# Altium footprint library Mine.PcbLib: 306 footprints (part 19 of 20)
Each footprint in its own frame and in the unit in brackets; x right, y up, seen from the top. Pads: shape width x height; smd on the part's side, far side on the other; paste and mask are expansions set on the pad; w line width, h text height; cw(c..) or ccw(c..) is an arc to the next point about the centre after c.
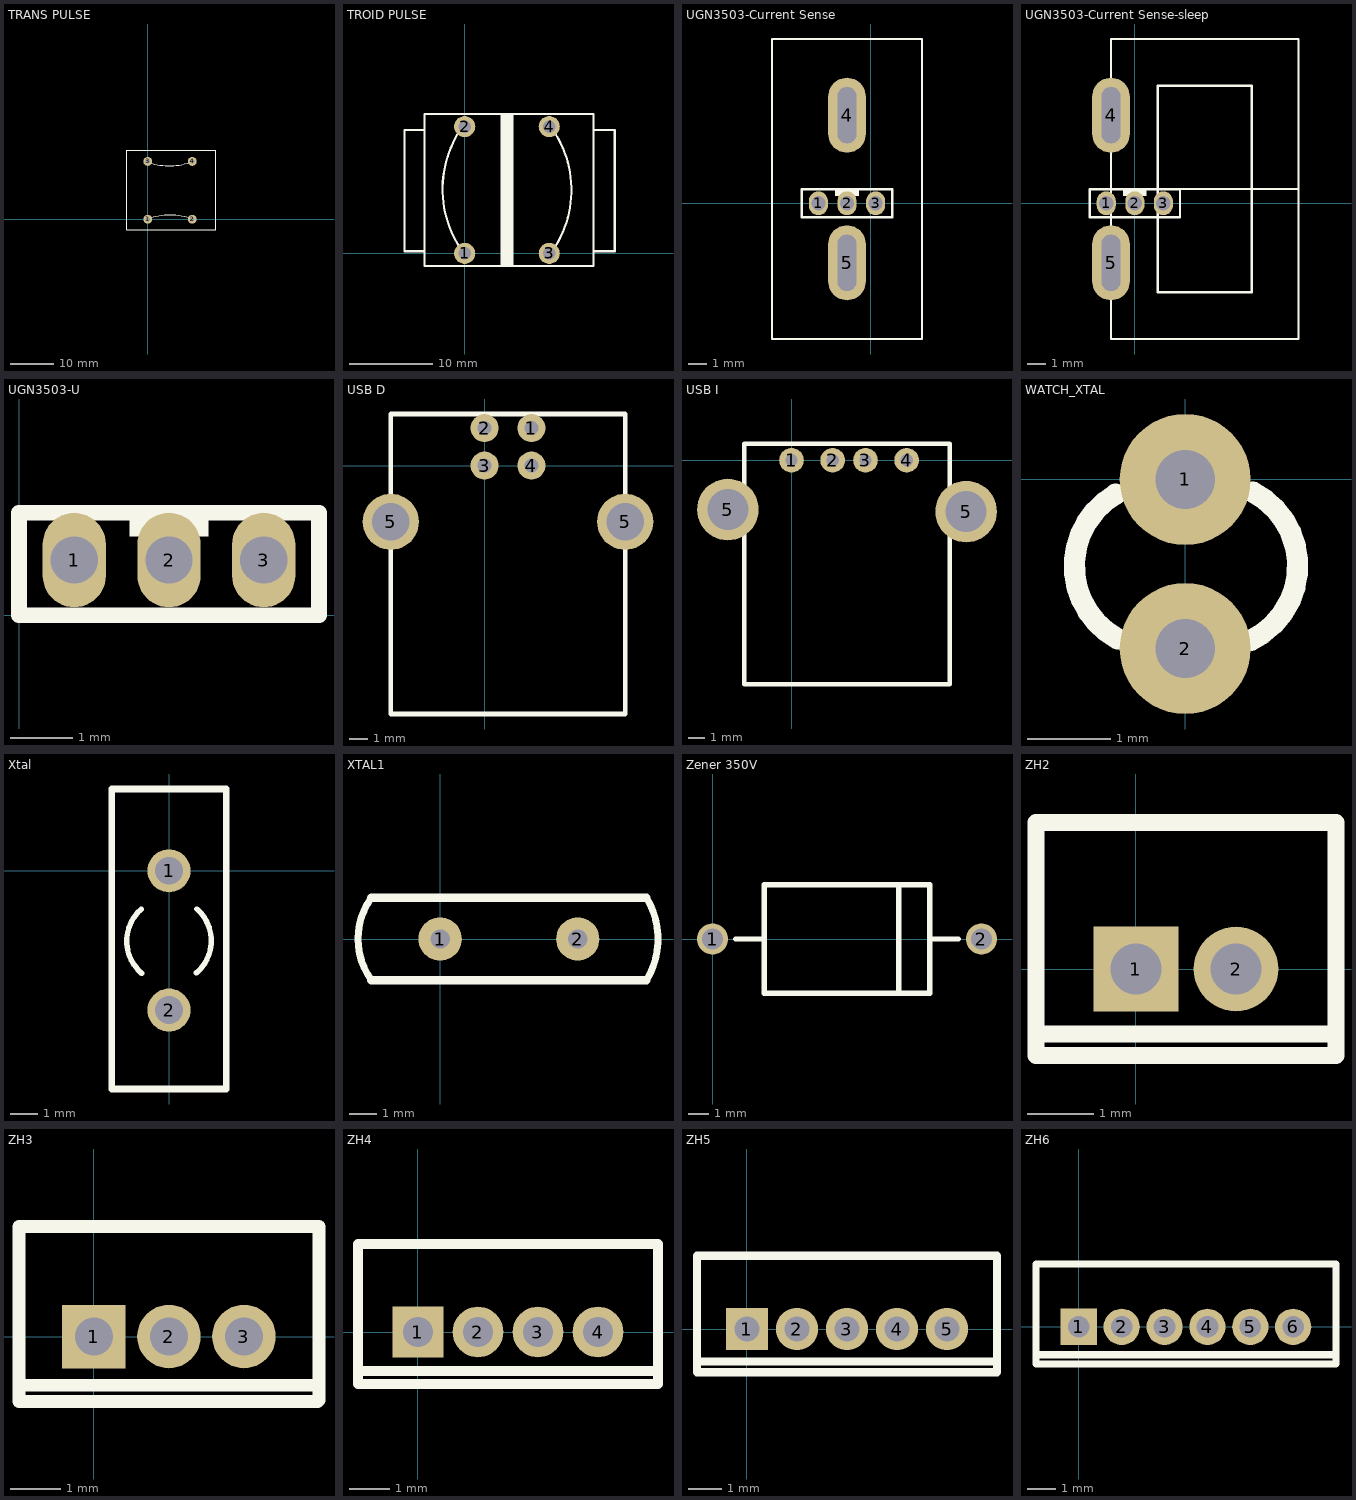
[diagram p18: the footprints below, top view; thin cyan lines are the x and y axes]

## TRANS PULSE [mil]
pads (4):
  round 80 hole 40: 1(0,0) 2(400,0) 3(0,520) 4(400,520)
Top Overlay:
  lines w10: -9.33,516.57 ccw(c190.87,1050.46) 400,520 ; 0,0 cw(c200,-520) 400,0 ; -190,-95 610,-95 610,620 -190,620 -190,-95

## TROID PULSE [mil]
pads (4):
  round 100 hole 60: 1(0,0) 2(0,600) 3(400,0) 4(400,600)
Top Overlay:
  rectangle: 170,-60 230,660
  lines w10: -190,10 -285,10 -285,585 -190,585 ; -7.1,605.17 ccw(c405,305) -2.26,-1.7 ; 404.08,-3.06 ccw(c0,300) 404.08,603.06 ; 610,10 710,10 710,585 610,585 ; -190,-60 610,-60 610,660 -190,660 -190,-60

## UGN3503-Current Sense [mil]
height 393.7
pads (5):
  oval 40x50 hole 30: 1(-110,0) 2(-50,0) 3(10,0)
  oval 78.74x157.48 hole 39.37 slot 118.11 at 90 deg: 4(-50,185) 5(-50,-125)
Top Overlay:
  rectangle: -75,15 -25,29
  lines w5: -207.48,-284.96 -207.48,344.96 107.48,344.96 107.48,-284.96 -207.48,-284.96 ; -145,-29.53 45,-29.53 45,29.53 -145,29.53 -145,-29.53

## UGN3503-Current Sense-sleep [mil]
height 393.7
pads (5):
  oval 40x50 hole 30: 1(-60,0) 2(0,0) 3(60,0)
  oval 78.74x157.48 hole 39.37 slot 118.11 at 90 deg: 4(-50,185) 5(-50,-125)
Top Overlay:
  rectangle: -25,15 25,29
  lines w5: -50,30 343.7,30 ; 245,246.54 48.43,246.54 48.43,245 48.43,-186.54 245.28,-186.54 245.28,246.54 ; -95,-29.53 95,-29.53 95,29.53 -95,29.53 -95,-29.53 ; -50,-284.96 -50,344.96 343.7,344.96 343.7,-284.96 -50,-284.96

## UGN3503-U [mil]
pads (3):
  oval 40x60 hole 30: 1(35,35) 2(95,35) 3(155,35)
Top Overlay:
  rectangle: 70,50 120,64
  lines w10: 0,0 190,0 190,65 0,65 0,0

## USB D [mil]
pads (6):
  round 60 hole 30: 1(100,80) 2(0,80) 3(0,0) 4(100,0)
  round 120 hole 80: 5(-200,-120) 5(300,-120)
Top Overlay:
  lines w10: -200,-530 300,-530 300,110 -200,110 -200,-530

## USB I [mil]
pads (6):
  round 60 hole 30: 1(0,0) 2(100,0) 3(180,0) 4(280,0)
  round 150 hole 100: 5(-155,-120) 5(425,-125)
Top Overlay:
  lines w10: -115,-545 385,-545 385,40 -115,40 -115,-545

## WATCH_XTAL [mil]
pads (2):
  round 62 hole 28: 1(0,0) 2(0,-80)
Top Overlay:
  lines w10: -33,-7 ccw(c-13.2,-40.94) -31.95,-75.47 ; 31.1,-76.13 ccw(c14.02,-40.84) 32,-6

## Xtal [mil]
height 157.48
pads (2):
  round 62.18 hole 40: 1(0,0) 2(0,-201.05)
Top Overlay:
  lines w7.87: -40.24,-55.54 ccw(c0,-101.42) -39.6,-147.85 ; 39.6,-147.45 ccw(c0,-101.02) 40.24,-55.15
  lines w10: -82.68,-314.96 -82.68,118.11 82.68,118.11 82.68,-314.96 -82.68,-314.96
3D body: height 137.8, standoff -157.48, extent -90,-321.85 93.07,125

## XTAL1 [mil]
pads (2):
  round 63 hole 28: 1(0,0) 2(200,0)
Top Overlay:
  lines w10: -100,60 ccw(c-16.77,0.04) -99.96,-59.97 ; 300,-60 ccw(c200,0) 300,60
  lines w12: -100,-60 300,-60 ; -100,60 300,60

## Zener 350V [mil]
pads (2):
  round 60 hole 40: 1(0,0) 2(520,0)
Top Overlay:
  lines w10: 45,0 100,0 ; 360,-105 360,105 ; 420,0 475,0 ; 100,0 100,-105 420,-105 420,105 100,105 100,0

## ZH2 [mil] "Miniature"
height 177.17
pads (2):
  rect 50x50 hole 30: 1(0,0)
  round 50 hole 30: 2(59.06,0)
Top Overlay:
  lines w10: -59.06,-38.39 118.11,-38.39 ; -59.06,86.61 -59.06,-51.18 118.11,-51.18 ; -58.07,86.61 118.11,86.61 118.11,-50.2

## ZH3 [mil] "Miniature"
height 177.17
pads (3):
  rect 50x50 hole 30: 1(0,0)
  round 50 hole 30: 2(59.06,0) 3(118.11,0)
Top Overlay:
  lines w10: -59.06,-38.39 176.18,-38.39 ; -59.06,86.61 -59.06,-51.18 176.18,-51.18 ; -58.07,86.61 177.17,86.61 177.17,-50.2

## ZH4 [mil] "Miniature"
height 177.17
pads (4):
  rect 50x50 hole 30: 1(0,0)
  round 50 hole 30: 2(59.06,0) 3(118.11,0) 4(177.17,0)
Top Overlay:
  lines w10: -59.06,-38.39 236.22,-38.39 ; -59.06,86.61 -59.06,-51.18 236.22,-51.18 ; -58.07,86.61 236.22,86.61 236.22,-50.2

## ZH5 [mil] "Miniature"
height 177.17
pads (5):
  rect 50x50 hole 30: 1(0,0)
  round 50 hole 30: 2(59.06,0) 3(118.11,0) 4(177.17,0) 5(236.22,0)
Top Overlay:
  lines w10: -59.06,86.61 -59.06,-51.18 295.28,-51.18 295.28,86.61 -58.07,86.61 ; -58.07,-38.39 295.28,-38.39

## ZH6 [mil] "Miniature"
height 177.17
pads (6):
  rect 50x50 hole 30: 1(0,0)
  round 50 hole 30: 2(59.06,0) 3(118.11,0) 4(177.17,0) 5(236.22,0) 6(295.28,0)
Top Overlay:
  lines w10: -59.06,-38.39 354.33,-38.39 ; -59.06,86.61 -59.06,-51.18 354.33,-51.18 354.33,86.61 -58.07,86.61